# Altium footprint library Footprints.PcbLib: 266 footprints (part 14 of 17)
Each footprint in its own frame and in the unit in brackets; x right, y up, seen from the top. Pads: shape width x height; smd on the part's side, far side on the other; paste and mask are expansions set on the pad; w line width, h text height; cw(c..) or ccw(c..) is an arc to the next point about the centre after c.
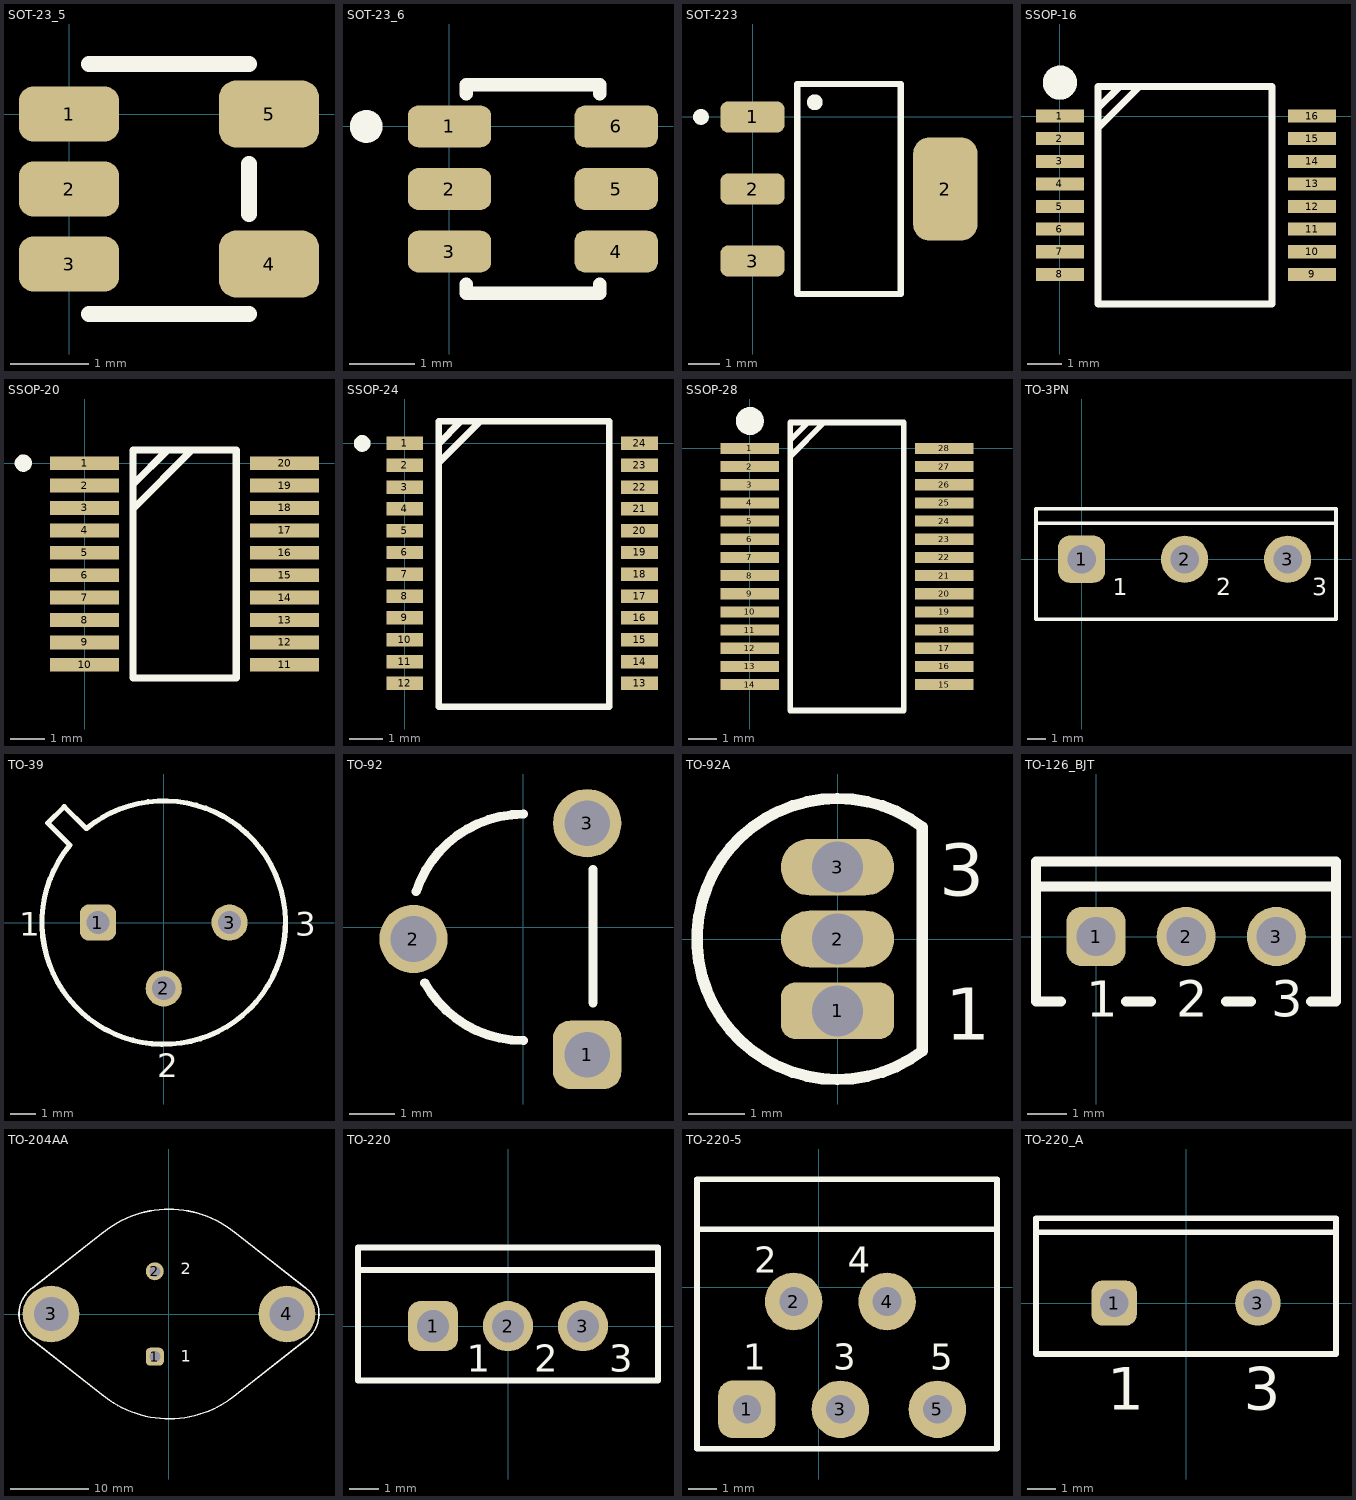
[diagram p13: the footprints below, top view; thin cyan lines are the x and y axes]

## SOT-23_5 [mm] "SOT-23, 5-Pins"
pads (5):
  rrect50% 1.27x0.7 smd: 1(0,0) 2(0,-0.953) 3(0,-1.905)
  rrect50% 1.27x0.85 smd: 4(2.54,-1.905) 5(2.54,0)
Top Overlay:
  lines w0.203: 0.254,-2.54 2.286,-2.54 ; 0.254,0.635 2.286,0.635 ; 2.286,-1.27 2.286,-0.635
3D body "SOT-23_5.STEP": height 1.1, standoff 0, extent -0.15,-2.4 2.65,0.499

## SOT-23_6 [mil] "SOT-23, 6-Pins"
pads (6):
  rrect50% 50x25 smd: 1(0,0) 2(0,-37.5) 3(0,-75) 4(100,-75) 5(100,-37.5) 6(100,0)
Top Overlay:
  circle w9.84: c-49.92,0 r4.92
  lines w8: 10,-94.69 10,-100 90,-100 90,-94.69 ; 10,19.68 10,25 90,25 90,19.68
3D body "SOT-23_6.STEP": height 43, standoff 0, extent 2.45,-92.52 97.95,17.48

## SOT-223 [mm] "SOT223, 4-Leads, Pitch 2,30mm,"
height 1.8
pads (4):
  rrect50% 2.05x1 smd: 1(0,0) 2(0,-2.3) 3(0,-4.6)
  rrect50% 2.05x3.3 smd: 2(6.15,-2.3)
Top Overlay:
  circle w0.25: c1.985,0.469 r0.125
  circle w0.25: c-1.649,0 r0.125
  lines w0.2: 1.425,-5.65 1.425,1.05 4.725,1.05 4.725,-5.65 1.425,-5.65
3D body "SOT-223.STEP": height 1.64, standoff -0.04, extent -0.442,-5.55 6.49,0.95

## SSOP-16 [mil]
pads (16):
  rect 55x15 smd: 1(0,0) 2(0,-26) 3(0,-52) 4(0,-78) 5(0,-104) 6(0,-130) 7(0,-156) 8(0,-182) 9(290,-182) 10(290,-156) 11(290,-130) 12(290,-104) 13(290,-78) 14(290,-52) 15(290,-26) 16(290,0)
Top Overlay:
  circle w19.68: c0,38.51 r9.84
  lines w8: 44,-13.48 91.48,34 ; 44,9.16 68.84,34 ; 44,-216 244,-216 244,34 44,34 44,-216
3D body "SSOP-16.STEP": height 78, standoff 0, extent -6.88,-214.51 304.12,34.45

## SSOP-20 [mm]
pads (20):
  rect 2x0.4 smd: 1(0,0) 2(0,-0.65) 3(0,-1.3) 4(0,-1.95) 5(0,-2.6) 6(0,-3.25) 7(0,-3.9) 8(0,-4.55) 9(0,-5.2) 10(0,-5.85) 11(5.8,-5.85) 12(5.8,-5.2) 13(5.8,-4.55) 14(5.8,-3.9) 15(5.8,-3.25) 16(5.8,-2.6) 17(5.8,-1.95) 18(5.8,-1.3) 19(5.8,-0.65) 20(5.8,0)
Top Overlay:
  circle w0.25: c-1.776,0 r0.125
  lines w0.203: 1.4,-1.325 3.1,0.375 ; 1.4,-0.625 2.4,0.375 ; 1.4,-6.225 1.4,0.375 4.4,0.375 4.4,-6.225 1.4,-6.225
3D body "TSSOP-20.STEP": height 0.97, standoff -0.03, extent -0.305,-6.175 6.105,0.325

## SSOP-24 [mm] "SSOP, 24-Leads, Body 8,7x5,4mm (max), Pitch 0,65mm, IPC Medium Density"
height 2
pads (24):
  rect 1.1x0.4 smd: 1(0,0) 2(0,-0.65) 3(0,-1.3) 4(0,-1.951) 5(0,-2.601) 6(0,-3.251) 7(0,-3.901) 8(0,-4.552) 9(0,-5.202) 10(0,-5.852) 11(0,-6.502) 12(0,-7.153) 13(7,-7.153) 14(7,-6.502) 15(7,-5.852) 16(7,-5.202) 17(7,-4.552) 18(7,-3.901) 19(7,-3.251) 20(7,-2.601) 21(7,-1.951) 22(7,-1.3) 23(7,-0.65) 24(7,0)
Top Overlay:
  circle w0.25: c-1.268,0 r0.125
  lines w0.203: 1.016,-0.571 2.222,0.635 ; 1.016,0.004 1.647,0.635 ; 1.016,-7.849 1.016,0.66 6.096,0.66 6.096,-7.849 1.016,-7.849
3D body "User Library-SOT340-1.STEP": height 1.85, standoff -0.05, extent -0.269,-7.698 7.28,0.535

## SSOP-28 [mm]
pads (28):
  rect 2.1x0.4 smd: 1(0,0) 2(0,-0.65) 3(0,-1.3) 4(0,-1.95) 5(0,-2.6) 6(0,-3.25) 7(0,-3.9) 8(0,-4.55) 9(0,-5.2) 10(0,-5.85) 11(0,-6.5) 12(0,-7.15) 13(0,-7.8) 14(0,-8.45) 15(6.95,-8.45) 16(6.95,-7.8) 17(6.95,-7.15) 18(6.95,-6.5) 19(6.95,-5.85) 20(6.95,-5.2) 21(6.95,-4.55) 22(6.95,-3.9) 23(6.95,-3.25) 24(6.95,-2.6) 25(6.95,-1.95) 26(6.95,-1.3) 27(6.95,-0.65) 28(6.95,0)
Top Overlay:
  circle w0.5: c0,0.978 r0.25
  lines w0.203: 1.45,-0.281 2.656,0.925 ; 1.45,0.294 2.081,0.925 ; 1.45,-9.375 5.5,-9.375 5.5,0.925 1.45,0.925 1.45,-9.375
3D body "SSOP-28.stp": height 1.95, standoff 0, extent -0.656,-9.492 7.569,1.008

## TO-3PN [mm] "TO, Thru-Hole, Vertical, 3 In-Line Leads; Pitch 2.54 mm"
pads (3):
  rrect50% 2.5x2.5 hole 1.5: 1(0,0)
  round 2.5 hole 1.5: 2(5.45,0) 3(10.9,0)
Top Overlay:
  lines w0.2: -2.413,1.905 13.462,1.905 ; -2.413,-3.175 -2.413,2.667 13.462,2.667 13.462,-3.175 -2.413,-3.175
  text "3" at 12.192,-1.905 h0.91
  text "2" at 7.112,-1.905 h0.91
  text "1" at 1.651,-1.905 h0.91
3D body "TO-3P.step": height 23.9, standoff -16, extent -2.466,-2.919 13.134,1.791

## TO-39 [mm] "Can; 3 Leads; Pin Circle Dia. 5.08 mm; Lead Dia. 0.48 mm (max)"
height 4.55
pads (3):
  rrect50% 1.4x1.4 hole 0.9: 1(-2.54,0)
  round 1.4 hole 0.9: 2(0,-2.54) 3(2.54,0)
Top Overlay:
  lines w0.2: -4.475,3.838 -3.838,4.475 -2.99,3.626 cw(c0,0) -3.626,2.99 -4.475,3.838
  text "3" at 5.08,-0.508 h0.91
  text "2" at -0.254,-5.969 h0.91
  text "1" at -5.588,-0.508 h0.91
3D body "TO-39_TO-205AD.step": height 6.6, standoff -11.82, extent -4.699,-4.7 4.688,4.7

## TO-92 [mm]
height 6.86
pads (3):
  rrect50% 1.5x1.5 hole 1: 1(1.397,-2.794)
  round 1.5 hole 1: 2(-2.413,-0.254) 3(1.397,2.286)
Top Overlay:
  lines w0.2: -2.357,0.786 cw(c0,0) 0,2.484 ; -2.165,-1.218 ccw(c0,0) 0,-2.484 ; 1.524,-1.651 1.524,1.27
3D body "User Library-TO-92-2_54.STEP": height 9.7, standoff -2.7, extent -2.639,-3.049 1.651,2.541

## TO-92A [mm] "TO, Flat Index; 3 In-Line, Axial Leads; Body Dia. 4.5mm; Leads 0.51 x 0.48 mm (max)"
height 6.86
pads (3):
  rrect50% 2x1 hole 0.9: 1(0,-1.27)
  oval 2x1 hole 0.9: 2(0,0) 3(0,1.27)
Top Overlay:
  lines w0.2: 1.5,-1.98 cw(c0,0) 1.5,1.98 1.5,-1.98
  text "1" at 1.905,-1.778 h0.91
  text "3" at 1.795,0.764 h0.91
3D body "TO-92-6.step": height 7, standoff -3, extent -2.5,-2.492 1.501,2.492

## TO-126_BJT [mm]
pads (3):
  rrect50% 1.5x1.5 hole 1: 1(0,0)
  round 1.5 hole 1: 2(2.29,0) 3(4.58,0)
Top Overlay:
  lines w0.254: -0.889,-1.651 -1.524,-1.651 -1.524,1.27 ; 0.762,-1.651 1.397,-1.651 ; 3.302,-1.651 3.937,-1.651 ; 5.461,-1.651 6.096,-1.651 6.096,1.27 ; -1.524,1.27 -1.524,1.905 6.096,1.905 6.096,1.27 ; -1.524,1.27 6.096,1.27
  text "1" at -0.254,-2.032 h0.91
  text "2" at 2.032,-2.032 h0.91
  text "3" at 4.445,-2.032 h0.91
3D body "BD135 (TO-126,SOT32) v4.step": height 15.7, standoff -2.25, extent -1.535,-0.825 6.265,1.875

## TO-204AA [mm] "Oval Flange Mount with (2) Offset Leads; Pin Spacing 10.92 mm; Lead Dia. 1.07 mm (max)"
height 7.87
pads (4):
  rrect50% 2.3x2.3 hole 1.4: 1(-1.815,-5.46)
  round 2.3 hole 1.4: 2(-1.815,5.46)
  round 7.25 hole 4.4: 3(-15.075,0) 4(15.075,0)
Top Overlay:
  lines w0.2: -17.427,-3.359 -8.299,-10.521 ; -17.427,-3.358 cw(c-15.075,0) -17.427,3.359 -8.299,10.521 ; -8.613,-10.265 ccw(c0,0) 8.298,-10.521 17.427,-3.359 ; -8.613,10.265 cw(c0,0) 8.613,10.265 ; 8.299,10.521 17.427,3.359 ; 17.308,3.439 cw(c15.075,0) 17.427,-3.358
  text "1" at 1.524,-6.096 h1.5
  text "2" at 1.524,5.08 h1.5
3D body "TO-204AA-3_Short.STEP": height 8.5, standoff -3, extent -19.795,-13.097 19.795,13.081

## TO-220 [mm] "TO, Thru-Hole, Vertical, Heatsink Mounted; 3 In-Line Leads; Pitch 2.54 mm"
height 22.9
pads (3):
  rrect50% 1.7x1.7 hole 1.1: 1(-2.54,0)
  round 1.7 hole 1.1: 2(0,0) 3(2.54,0)
Top Overlay:
  lines w0.2: -5.08,1.905 5.08,1.905 ; -5.08,-1.85 -5.08,2.667 5.08,2.667 5.08,-1.85 -5.08,-1.85
  text "3" at 3.437,-1.539 h0.91
  text "2" at 0.897,-1.539 h0.91
  text "1" at -1.393,-1.539 h0.91
3D body "TO-220-4.STEP": height 20.06, standoff -8.74, extent -5.1,-1.833 5.1,2.667

## TO-220-5 [mil]
height 598.43
pads (5):
  rrect50% 80x80 hole 39.37: 1(-100,-170)
  round 80 hole 40: 2(-35,-20) 3(30,-170) 4(95,-20) 5(165,-170)
Top Overlay:
  lines w7.87: -169.45,80.55 247.87,80.55 ; -169.45,-225 247.87,-225 247.87,150.24 -169.45,150.24 -169.45,-225
  text "1" at -105,-115 h36
  text "5" at 155,-115 h36
  text "2" at -90,20 h36
  text "3" at 20,-115 h36
  text "4" at 40,20 h36
3D body "TO220-5.STEP": height 840.55, standoff -103.94, extent -170,-174.41 230,150

## TO-220_A [mm] "TO, Thru-Hole, Vertical, Heatsink Mounted; 3 In-Line Leads (1 Absent); Pitch 2.54 mm"
height 19.3
pads (2):
  rrect50% 1.6x1.6 hole 1: 1(-2.54,0)
  round 1.6 hole 1: 3(2.54,0)
Top Overlay:
  lines w0.2: -5.3,2.5 5.3,2.5 ; -5.3,-1.8 -5.3,3 5.3,3 5.3,-1.8 -5.3,-1.8
  text "1" at -2.79,-3.775 h1.5
  text "3" at 2.04,-3.775 h1.5
3D body "User Library-TO220-2_V-S.STEP": height 20, standoff -2.2, extent -4.949,-1.782 5.051,2.718